# Altium integrated library Mastermind Devices.IntLib: 910 symbols (part 2 of 6) (continued)
## DIODE-DIP (continued)
DIODE   General purpose 1N400x type rectifier    (With bigger pads)   http://www.ladyada.net/library/pcb/eaglelibrary.html
footprint DO41-10
pins: A, C

## DIODE-DO214-AA
designator D13, comment 1N4007
SMD Diode DO214-AC
footprint DO214-AA
pins: A, C

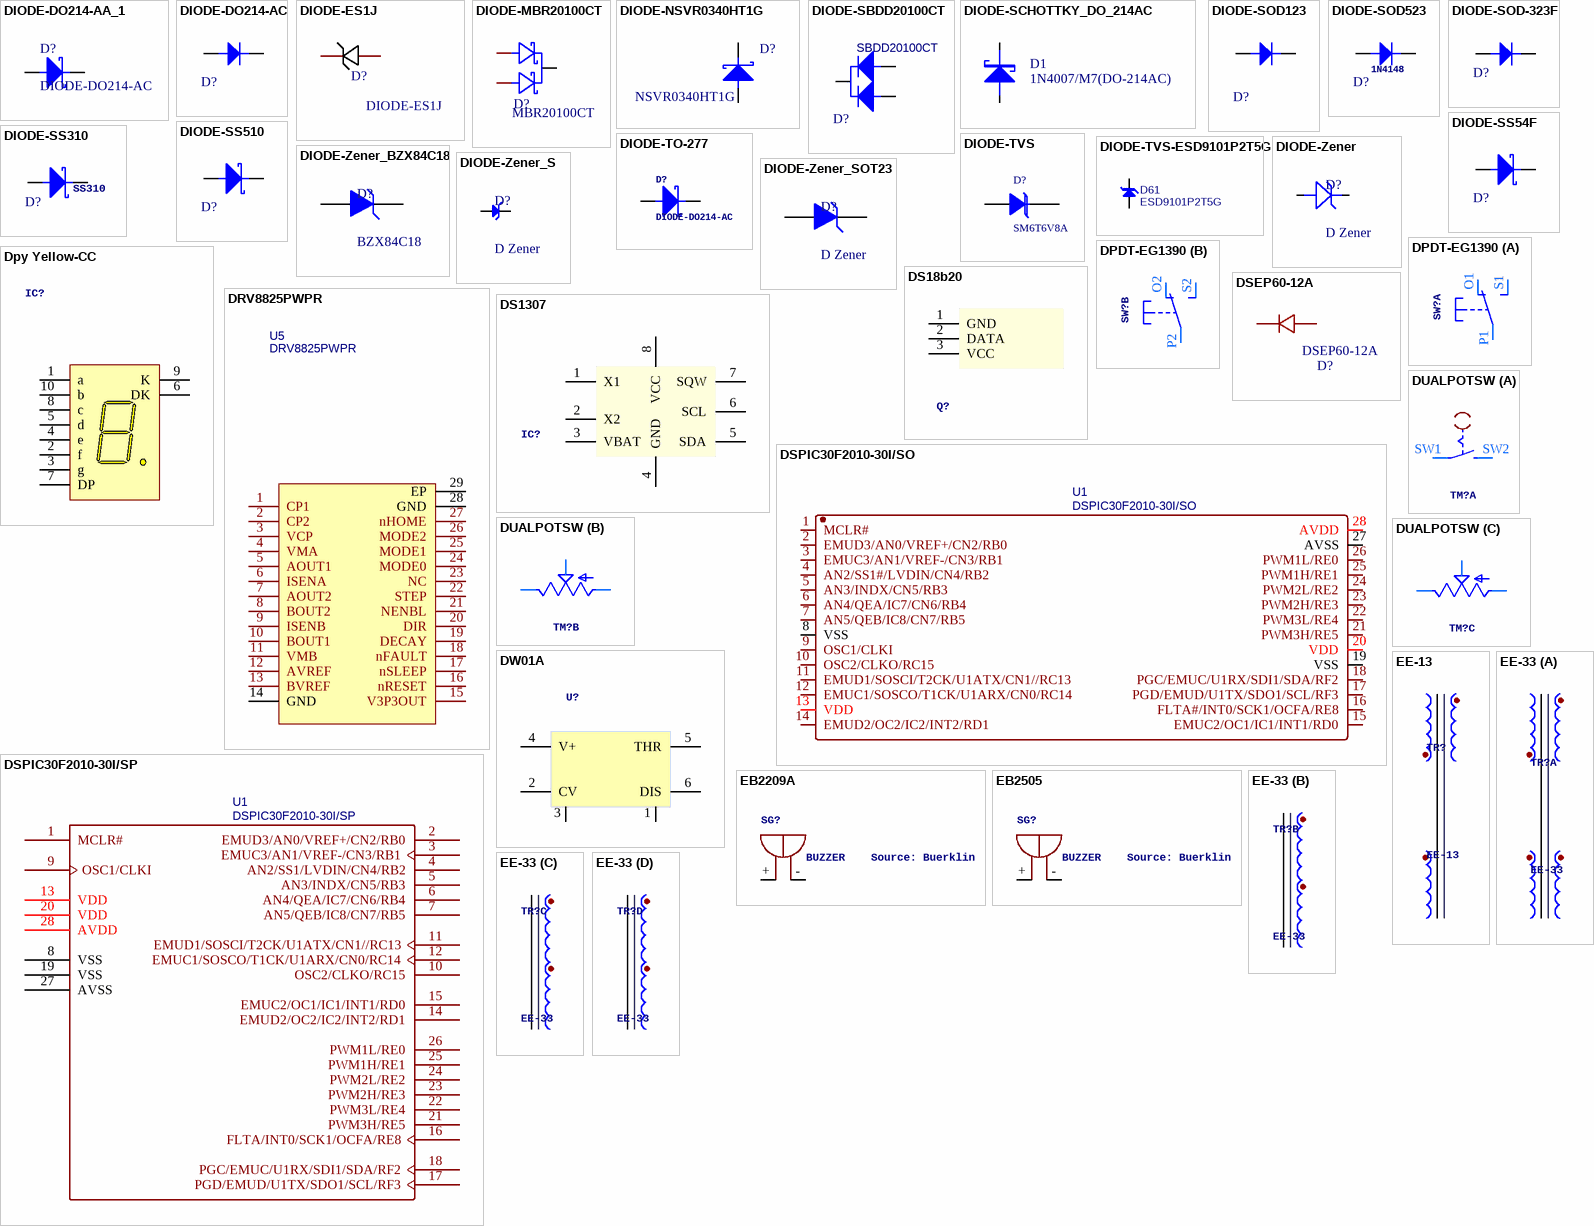
[diagram p10: symbols DIODE-DO214-AA_1 to EE-33]

## DIODE-DO214-AA_1
designator D?, comment DIODE-DO214-AC
SMD DIODE-DO214-AC
footprint DO214-AA
pins: A, C

## DIODE-DO214-AC
designator D?  (value not drawn)
Designator: *
footprint DO214-AC
pins: A, C

## DIODE-ES1J
designator D?
Manufacturer: MDD(辰达半导体); Manufacturer Part: ES1J; Symbol: ES1JG_C412438; Device: ES1J_C412438; Add into BOM: yes; Forward Voltage (Vf@If): 1.7V@1A; Reverse Leakage Current: 5uA@600V; LCSC Part Name: 电压:600V 电流:1A; Supplier Part: C412438; Supplier Footprint: SMA; JLCPCB Part Class: Extended Part; Datasheet: https://atta.szlcsc.com/upload/public/pdf/source/20230314/8FCBE4D1988E86B6B35ACD92F03E7C76.pdf; Supplier: LCSC; Convert to PCB: yes; Operating Temperature: -55℃~+150℃@(Tj)
footprint SMA_L4.4-W2.8-LS5.4-RD
pins: 1 C, 2 A

## DIODE-MBR20100CT
designator D?, comment MBR20100CT
Manufacturer: 晶导微电子; Symbol: MBR20100CT_C779290; Add into BOM: yes; Diode Configuration: 1 Pair Common Cathode; Voltage - Forward(Vf@If): 850mV@10A; Voltage - DC Reverse(Vr): 100V; Current - Rectified: 20A; Reverse Leakage Current (Ir): 50uA@100V; Operating Junction Temperature Range: -55℃~+150℃; Non-Repetitive Peak Forward Surge Current: 150A; Device: MBR20100CT_C779290; LCSC Part Name: 电压:100V 电流:20A; Supplier Part: C779290; Manufacturer Part: MBR20100CT; Supplier Footprint: TO-220; JLCPCB Part Class: Extended Part; Datasheet: https://item.szlcsc.com/datasheet/MBR20100CT/828963.html; Supplier: LCSC; Convert to PCB: yes
footprint TO-220-3_L10.0-W4.5-P2.54-L
3D model TO-220-3_L10.0-W4.5-P2.54-L
pins: 1 A, 2 K, 3 A

## DIODE-NSVR0340HT1G
designator D?, comment NSVR0340HT1G
Schottky Diode / NSVR0340HT1G
footprint SOD-323
pins: A, K C

## DIODE-SBDD20100CT
designator D?, comment SBDD20100CT
Schottky Barrier Diodes; Manufacturer: CJ(江苏长电/长晶); Contributor: LCSC; Supplier: LCSC; Supplier Part: C513356; Manufacturer Part: SBDD20100CT; JLCPCB Part Class: Extended Part; spicePre: U; spiceSymbolName: SBDD20100CT
footprint TO252
pins: 1 A, 2 A, 3 K

## DIODE-SCHOTTKY_DO_214AC
designator D1, comment 1N4007/M7(DO-214AC)
Surface mount schottky diode DO-214AC(SMA) Package
footprint SMT_DIODE_DO_214AC (DO-214AC(SMA) Package)
pins: 1 A, 2 K

## DIODE-SOD123
designator D?
Schottky Diode
footprint SOD-123
footprint SOD-123HE1_L3.0-W2.0-LS3.7-RD
pins: 1 C, 2 A

## DIODE-SOD523
designator D?, comment 1N4148
footprint SOD-523
pins: A, K C

## DIODE-SOD-323F
designator D?, comment Diode   SMADIODE - SMA Surface Mount Package  20V 1A Schottky Diode Digikey: 641-1014-6-ND    DO-1N4148 - Through Hole Small Current Diode SOD-123 20V 1 A (.5mV Vf) Schottky Diode - Digikey: MBRX120TPMSCT-ND    SOD-323 10V 570mA (.38mV Vf, 3ns) Schottky Diode - Digikey: ZLLS410CT-ND    SOD-523 30V 30mA Schottky Diode (RB751S-40TE61) - Digikey: RB751S-40TE61CT-ND    SOT23-R/W - SOT23 Package (R = Solder Paste/Reflow Ovens, W = Hand-Soldering)  BAT54Film 40V 300mA - Digikey: 497-7162-1-ND  (value not drawn)
Parameter 1: *
footprint SOD-323
pins: A, K C

## DIODE-SS54F
designator D?, comment DIODE-DO214-AC  (value not drawn)
Schottky Diode; Designator: *
footprint DO214-AC
footprint DO-214AB_L6.9-W5.9-LS7.9-RD
pins: A, C

## DIODE-SS310
designator D?, comment SS310
Schottky Diode
footprint DO214A
pins: 1 A, 2 C

## DIODE-SS510
designator D?, comment SS510  (value not drawn)
Schottky Diode; Designator: *
footprint SMC_L7.1-W6.2-LS8.1-RD
pins: 1 C, 2 A

## DIODE-TO-277
designator D?, comment DIODE-DO214-AC
Schottky Diode
footprint TO-277
pins: A, C

## DIODE-TVS
designator D?, comment SM6T6V8A
Tvs Diode, 6.2V, 5W; Manufacturer: Microsemi; Revision: 31-Oct-2003
footprint DO214
pins: 1 A, 2 K

## DIODE-TVS-ESD9101P2T5G
designator D61, comment ESD9101P2T5G
ESD Protection Diode; Manufacturer Name: OnSemi; Manufacturer Part No.: ESD9101P2T5G
footprint SOD-923 (SOD-923, 2-Leads, Body 0.60x1.00mm, IPC Medium Density)
pins: 1 C (power), 2 A (power)

## DIODE-Zener
designator D?, comment D Zener
Zener Diode; Published: 8-Jun-2000; LatestRevisionDate: 17-Jul-2002; LatestRevisionNote: Re-released for DXP Platform.; PackageReference: DIODE-0.7; Publisher: Altium Limited; PackageDescription: Diode, Thru-Hole; 2 Leads; 0.7 in Pin Spacing
simulation model ZENER (Diode)
signal-integrity model D Zener
footprint SOD-323
footprint DO100-AA
footprint DO-1N4148
footprint DO-1N4148 - 10mm
footprint SOD-123HE1_L3.0-W2.0-LS3.7-RD - KA
footprint DO-35_BD1.7-L3.6-P10.00-D0.5-FD
pins: A, K

## DIODE-Zener_BZX84C18
designator D?, comment BZX84C18
Zener Diode 18V; Published: 8-Jun-2000; LatestRevisionDate: 17-Jul-2002; LatestRevisionNote: Re-released for DXP Platform.; PackageReference: DIODE-0.7; Publisher: Altium Limited; PackageDescription: Diode, Thru-Hole; 2 Leads; 0.7 in Pin Spacing
footprint SOT23; pin to pad 1>1+2
pins: 1 A, 3 K

## DIODE-Zener_S
designator D?, comment D Zener
Zener Diode, Vz=15V, 300mW; Published: 8-Jun-2000; LatestRevisionDate: 17-Jul-2002; LatestRevisionNote: Re-released for DXP Platform.; PackageReference: DIODE-0.7; Publisher: Altium Limited; PackageDescription: Diode, Thru-Hole; 2 Leads; 0.7 in Pin Spacing
simulation model ZENER (Diode)
signal-integrity model D Zener
footprint SOD-323
pins: A (power), K C (power)

## DIODE-Zener_SOT23
designator D?, comment D Zener
Zener Diode; Published: 8-Jun-2000; LatestRevisionDate: 17-Jul-2002; LatestRevisionNote: Re-released for DXP Platform.; PackageReference: DIODE-0.7; Publisher: Altium Limited; PackageDescription: Diode, Thru-Hole; 2 Leads; 0.7 in Pin Spacing
footprint SOT23
pins: 1 A, 3 K

## DPDT-EG1390
designator SW?
footprint EG1390
part A pins: O1 O, P1 P, S1 S
part B pins: O2 O, P2 P, S2 S

## Dpy Yellow-CC
designator IC?, comment TIMERChanged DIP package to have round (not oval) pin pads    http://www.ladyada.net/library/pcb/eaglelibrary.html  (value not drawn)
footprint 7-Segment
pins: 1 a "Anode", 2 f "Anode", 3 g "Anode", 4 e "Anode", 5 d "Anode", 6 DK "Cathode", 7 DP "Anode", 8 c "Anode", 9 K "Cathode", 10 b "Anode"

## DRV8825PWPR
designator U5
BOM_Manufacturer: TI(德州仪器); BOM_Supplier: LCSC; BOM_Manufacturer Part: DRV8825PWPR; BOM_Supplier Part: C81582; BOM_JLCPCB Part Class: Extended Part; spicePre: U; spiceSymbolName: DRV8825PWPR
footprint HTSSOP-28_L9.7-W4.4-P0.65-LS6.4-BL-EP
pins: 1 CP1, 2 CP2, 3 VCP, 4 VMA, 5 AOUT1, 6 ISENA, 7 AOUT2, 8 BOUT2, 9 ISENB, 10 BOUT1, 11 VMB, 12 AVREF, 13 BVREF, 14 GND, 15 V3P3OUT, 16 nRESET, 17 nSLEEP, 18 nFAULT, 19 DECAY, 20 DIR, 21 NENBL, 22 STEP, 23 NC, 24 MODE0, 25 MODE1, 26 MODE2, 27 nHOME, 28 GND, 29 EP

## DS18b20
designator Q?
Dellas temperature sensor
footprint TO92-INLINE
pins: 1 GND, 2 DATA, 3 VCC

## DS1307
designator IC?, comment DS1307   Real time clock (RTC) with battery backup ability. Talk to it via i2c  (value not drawn)
footprint DIL08
footprint SOP8
pins: 1 X1, 2 X2, 3 VBAT, 4 GND, 5 SDA, 6 SCL, 7 SQW (power), 8 VCC (power)

## DSEP60-12A
designator D?
Manufacturer: Littelfuse/IXYS; Add into BOM: yes; Forward Voltage (Vf@If): 2.66V@60A; Reverse Leakage Current: 650uA@1.2kV; Symbol: DSEP60-12A; Device: DSEP60-12A; LCSC Part Name: 电压:1.2kV 电流:60A; Supplier Part: C130473; Manufacturer Part: DSEP60-12A; Supplier Footprint: TO-247AC; JLCPCB Part Class: Extended Part; Datasheet: https://atta.szlcsc.com/upload/public/pdf/source/20171113/C130473_15105610714251115425.pdf; Supplier: LCSC; Convert to PCB: yes; Operating Temperature: -55℃~+175℃@(Tj)
footprint TO-247AC_L15.8-W5.0-P10.88-L
3D model TO-247AC_2PIN-L15.8-W5.0-H25.0-P10.88-L
pins: 1 K, 2 A

## DSPIC30F2010-30I/SO
designator U1
Manufacturer: MICROCHIP(美国微芯); Supplier: LCSC; Manufacturer Part: DSPIC30F2010-30I/SO; Supplier Part: C9797; JLCPCB Part Class: Extended Part; spicePre: U; spiceSymbolName: DSPIC30F2010-30I/SO
footprint SOIC-28_L18.0-W7.5-P1.27-LS10.3-BL
pins: 1 MCLR#, 2 EMUD3/AN0/VREF+/CN2/RB0, 3 EMUC3/AN1/VREF-/CN3/RB1, 4 AN2/SS1#/LVDIN/CN4/RB2, 5 AN3/INDX/CN5/RB3, 6 AN4/QEA/IC7/CN6/RB4, 7 AN5/QEB/IC8/CN7/RB5, 8 VSS, 9 OSC1/CLKI, 10 OSC2/CLKO/RC15, 11 EMUD1/SOSCI/T2CK/U1ATX/CN1//RC13, 12 EMUC1/SOSCO/T1CK/U1ARX/CN0/RC14, 13 VDD, 14 EMUD2/OC2/IC2/INT2/RD1, 15 EMUC2/OC1/IC1/INT1/RD0, 16 FLTA#/INT0/SCK1/OCFA/RE8, 17 PGD/EMUD/U1TX/SDO1/SCL/RF3, 18 PGC/EMUC/U1RX/SDI1/SDA/RF2, 19 VSS, 20 VDD, 21 PWM3H/RE5, 22 PWM3L/RE4, 23 PWM2H/RE3, 24 PWM2L/RE2, 25 PWM1H/RE1, 26 PWM1L/RE0, 27 AVSS, 28 AVDD

## DSPIC30F2010-30I/SP
designator U1
Manufacturer: MICROCHIP(美国微芯); Supplier: LCSC; Manufacturer Part: DSPIC30F2010-30I/SP; Supplier Part: C134088; JLCPCB Part Class: Extended Part; spicePre: U; spiceSymbolName: DSPIC30F2010-30I/SP
footprint DIP-28_L34.6-W7.3-P2.54-LS10.2-BL
footprint SOIC-28_L18.0-W7.5-P1.27-LS10.3-BL
pins: 1 MCLR#, 2 EMUD3/AN0/VREF+/CN2/RB0, 3 EMUC3/AN1/VREF-/CN3/RB1, 4 AN2/SS1/LVDIN/CN4/RB2, 5 AN3/INDX/CN5/RB3, 6 AN4/QEA/IC7/CN6/RB4, 7 AN5/QEB/IC8/CN7/RB5, 8 VSS, 9 OSC1/CLKI, 10 OSC2/CLKO/RC15, 11 EMUD1/SOSCI/T2CK/U1ATX/CN1//RC13, 12 EMUC1/SOSCO/T1CK/U1ARX/CN0/RC14, 13 VDD, 14 EMUD2/OC2/IC2/INT2/RD1, 15 EMUC2/OC1/IC1/INT1/RD0, 16 FLTA/INT0/SCK1/OCFA/RE8, 17 PGD/EMUD/U1TX/SDO1/SCL/RF3, 18 PGC/EMUC/U1RX/SDI1/SDA/RF2, 19 VSS, 20 VDD, 21 PWM3H/RE5, 22 PWM3L/RE4, 23 PWM2H/RE3, 24 PWM2L/RE2, 25 PWM1H/RE1, 26 PWM1L/RE0, 27 AVSS, 28 AVDD

## DUALPOTSW
designator TM?
footprint RK0971221
part A pins: SW1 P, SW2 S
part B pins: A2 E, B2 A, W2 S
part C pins: A1 E, B1 A, W1 S

## DW01A
designator U?
footprint SOT23-6
pins: 1 TR, 2 CV, 3 GND (power), 4 V+ (power), 5 THR, 6 DIS

## EB2209A
designator SG?, comment BUZZER    Source: Buerklin
OC_FARNELL: unknown; OC_NEWARK: unknown
footprint EB2209A
pins: +, -

## EB2505
designator SG?, comment BUZZER    Source: Buerklin
OC_FARNELL: unknown; OC_NEWARK: unknown
footprint EB2505
pins: +, -

## EE-13
designator TR?
TRANSFORMER   1 primary winding, 2 secondary windings   ERA
footprint EE13
footprint EE13 - thx208
pins: 1, 2, 3, 4, 5, 6

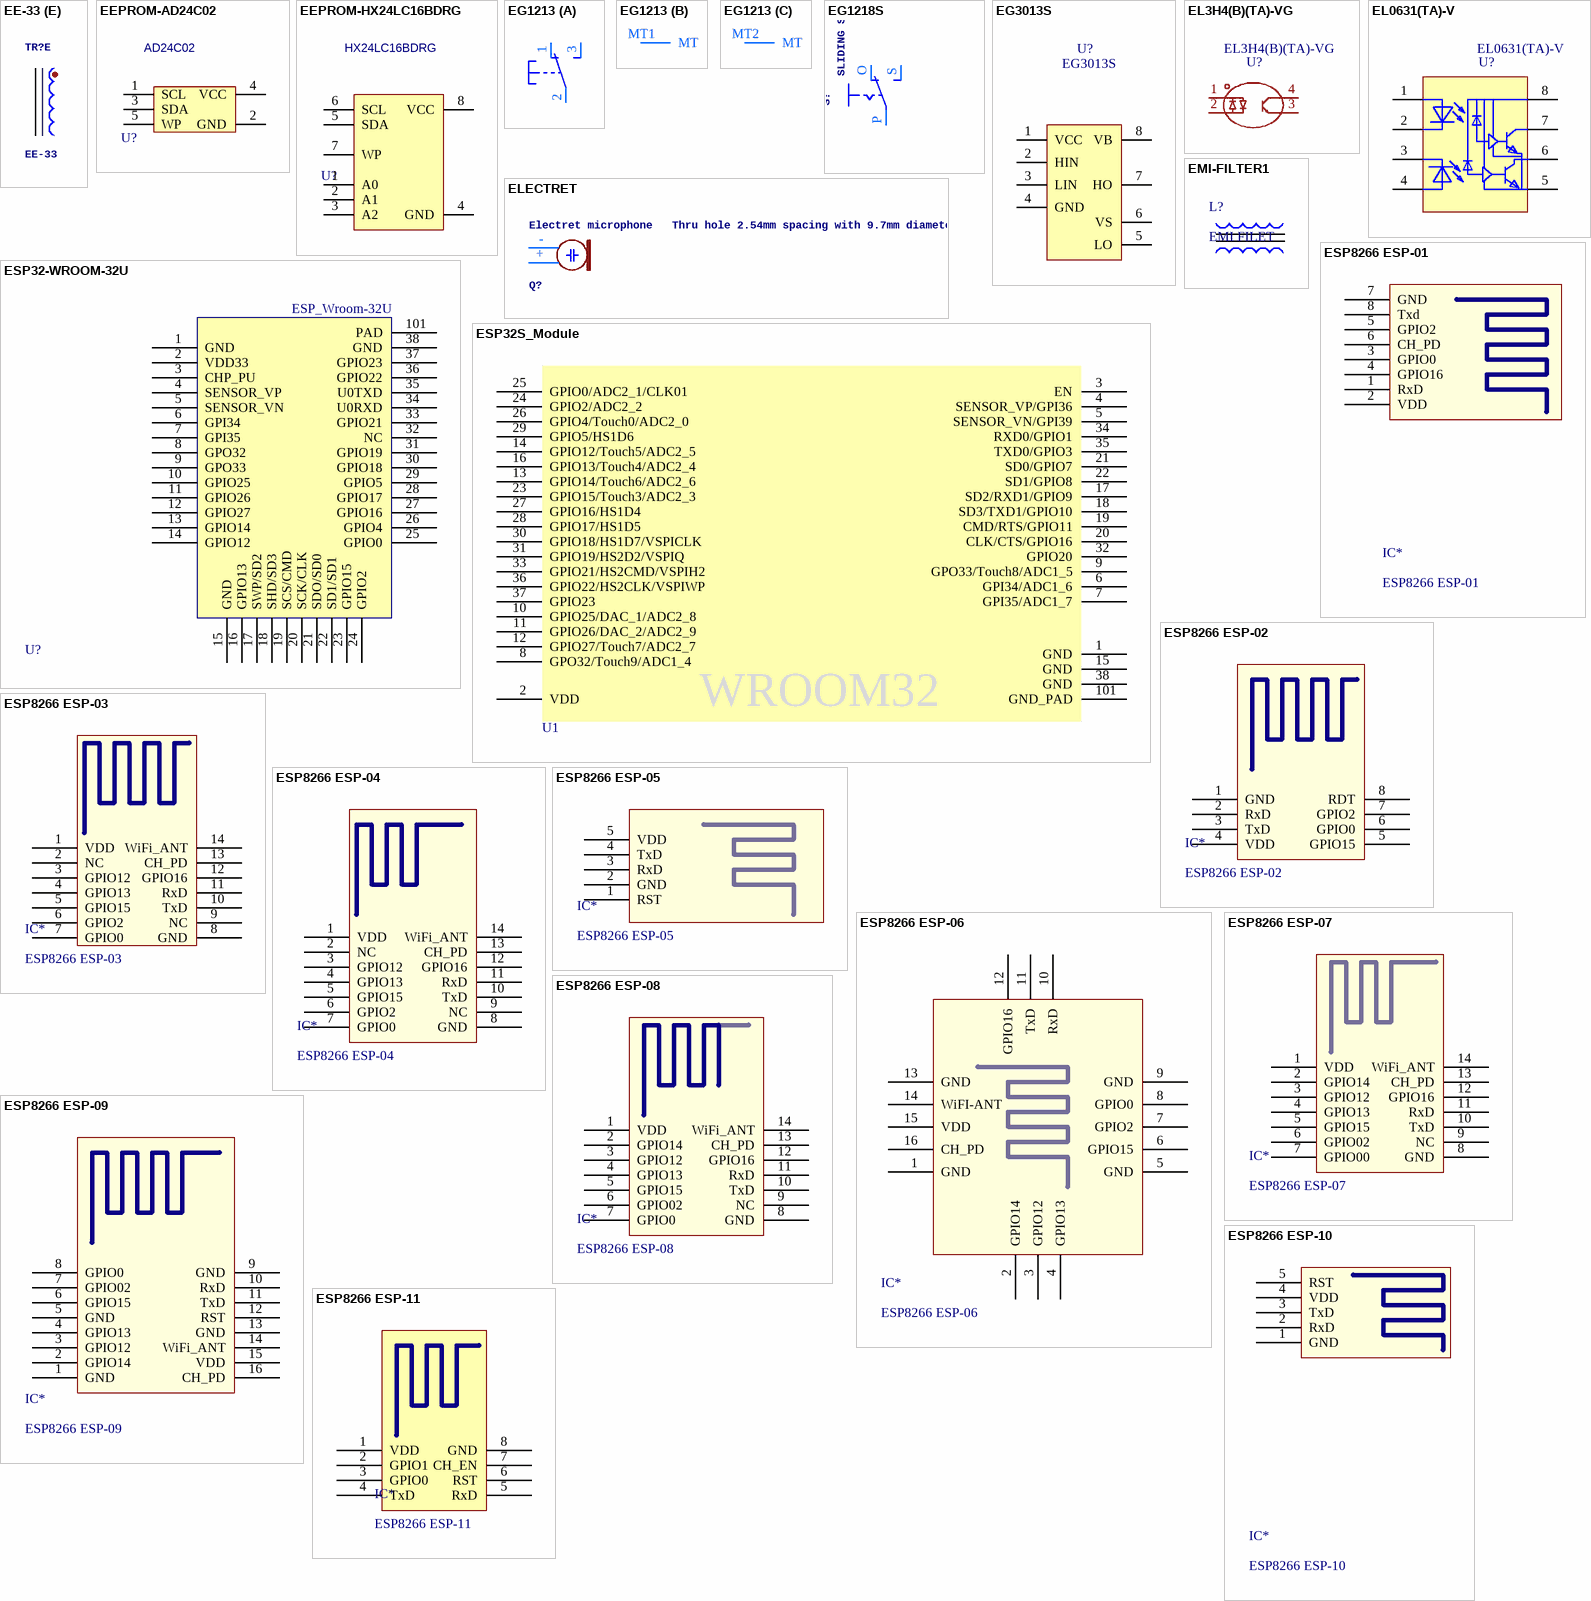
[diagram p11: symbols EE-33 to ESP8266 ESP-11]

## EE-33
designator TR?
EI33 EE33 18+18pin Vertical Transfomer Bobbin+PC40 ferrite core
footprint EE33
part A pins: 1 NC hidden to GND, 2 NC hidden to GND, 3 NC hidden to GND, 13, 14, 15, 16, 19, 20, 21 NC hidden to GND, 22, 23
part B pins: 4, 5, 6
part C pins: 7, 8, 9
part D pins: 10, 11, 12
part E pins: 17, 18

## EEPROM-AD24C02
designator U?, comment AD24C02
Manufacturer: IDCHIP(英锐芯); Contributor: lcsc; Supplier: LCSC; Supplier Part: C5125083; Manufacturer Part: AD24C02; JLCPCB Part Class: Extended Part; spicePre: U; spiceSymbolName: AD24C02
footprint SOT23-5L
pins: 1 SCL, 2 GND, 3 SDA, 4 VCC, 5 WP

## EEPROM-HX24LC16BDRG
designator U?, comment HX24LC16BDRG
EEPROM; Manufacturer: HGC(深圳汉芯); Contributor: lcsc; Supplier: LCSC; Supplier Part: C2987259; Manufacturer Part: HX24LC16BDRG; JLCPCB Part Class: Extended Part; spicePre: U; spiceSymbolName: HX24LC16BDRG
footprint SOIC-8_L4.9-W3.9-P1.27-LS6.0-BL
footprint SOIC-8E (SOIC, 8-Leads, Body 4.90x3.90mm, Pitch 1.27mm, IPC Medium Density)
pins: 1 A0, 2 A1, 3 A2, 4 GND, 5 SDA, 6 SCL, 7 WP, 8 VCC

## EG1213
designator S?, comment E-Switch right-angle slide SPDT Part #EG1213    http://www.ladyada.net/library/eagle  (value not drawn)
footprint EG1213
part A pins: 1 O, 2 P, 3 S
part B pins: MT1 MT
part C pins: MT2 MT

## EG1218S
designator S?, comment SLIDING SWITCH   0.1" spacing through hole, vertical SPDT slide switch    http://www.ladyada.net/library/pcb/eaglelibrary.html
footprint EG1218
pins: O, P, S

## EG3013S
designator U?
SOP-8 Gate Drivers ROHS; Manufacturer: EG(屹晶微); Add into BOM: yes; Symbol: EG3013S; Device: EG3013S; LCSC Part Name: EG3013S; Supplier Part: C5138297; Manufacturer Part: EG3013S; Supplier Footprint: SOP-8; JLCPCB Part Class: Extended Part; Datasheet: https://atta.szlcsc.com/upload/public/pdf/source/20240401/B57332368F1567A90B75A8EC20454C1B.pdf; Supplier: LCSC; Convert to PCB: yes
footprint SOP8
pins: 1 VCC, 2 HIN, 3 LIN, 4 GND, 5 LO, 6 VS, 7 HO, 8 VB

## EL3H4(B)(TA)-VG
designator U?
Manufacturer: EVERLIGHT(亿光); Add into BOM: yes; Symbol: EL3H4(B)(TA)-VG; Device: EL3H4(B)(TA)-VG; LCSC Part Name: EL3H4(B)(TA)-VG; Supplier Part: C146689; Manufacturer Part: EL3H4(B)(TA)-VG; Supplier Footprint: SOP-4-1.27mm; JLCPCB Part Class: Extended Part; Supplier: LCSC; Convert to PCB: yes
footprint OPTO-SMD-4_L4.4-W2.7-P1.27-LS7.0-TL
pins: 1 A, 2 C, 3 E, 4 C

## EL0631(TA)-V
designator U?
Manufacturer: EVERLIGHT(亿光); Add into BOM: yes; Input Type: DC; Supply Voltage: 7V; Isolation Voltage(rms): 3.75kV; Common Mode Transient Immunity (CMTI): 10kV/us; Data Rate: 10Mbit/s; Propagation Delay tpLH/tpHL: 100ns；100ns; Number of Channels: 2; Symbol: EL0631(TA)-V; Device: EL0631(TA)-V; LCSC Part Name: DC输入 2通道 隔离电压(rms):3750V; Supplier Part: C110806; Manufacturer Part: EL0631(TA)-V; Supplier Footprint: SOIC-8; JLCPCB Part Class: Extended Part; Datasheet: https://atta.szlcsc.com/upload/public/pdf/source/20170505/1493957884590.pdf; Supplier: LCSC; Convert to PCB: yes; Operating Temperature: -40℃~+100℃
footprint SOIC-8_L4.9-W3.9-P1.27-LS6.0-BL
pins: 1, 2, 3, 4, 5, 6, 7, 8

## ELECTRET
designator Q?, comment Electret microphone   Thru hole 2.54mm spacing with 9.7mm diameter
footprint 9.7ELECTRET
pins: + 2, - 1

## EMI-FILTER1
designator L?, comment EMI FILET
Common Mode Noise Filter
footprint FIL_DLW5BTM501SQ2L
footprint FIL_CoreXX
footprint FIL_Z0021A
pins: 1, 2, 3, 4

## ESP32-WROOM-32U
designator U?, comment ESP-Wroom-32U_Module  (value not drawn)
WiFi Modules ROHS; Datasheet: https://espressif.com/sites/default/files/documentation/esp_wroom_32_datasheet_en.pdf
footprint ESP32-WROOM-32U (Esp32S Module wide for hand soldering)
pins: 1 GND (power), 2 VDD33 (power), 3 CHP_PU (power), 4 SENSOR_VP, 5 SENSOR_VN, 6 GPI34, 7 GPI35, 8 GPO32, 9 GPO33, 10 GPIO25, 11 GPIO26, 12 GPIO27, 13 GPIO14, 14 GPIO12, 15 GND (power), 16 GPIO13, 17 SWP/SD2, 18 SHD/SD3, 19 SCS/CMD, 20 SCK/CLK, 21 SDO/SD0, 22 SD1/SD1, 23 GPIO15, 24 GPIO2, 25 GPIO0, 26 GPIO4, 27 GPIO16, 28 GPIO17, 29 GPIO5, 30 GPIO18, 31 GPIO19, 32 NC, 33 GPIO21, 34 U0RXD, 35 U0TXD, 36 GPIO22, 37 GPIO23, 38 GND (power), 101 PAD (power)
text: ESP_Wroom-32U

## ESP32S_Module
designator U1  (value not drawn)
Esp-32S; Datasheet: https://espressif.com/sites/default/files/documentation/esp_wroom_32_datasheet_en.pdf
footprint ESP32S (ESP32S-Module)
footprint ESP32S_W (Esp32S Module wide for hand soldering)
pins: 1 GND (power), 2 VDD (power), 3 EN (power), 4 SENSOR_VP/GPI36, 5 SENSOR_VN/GPI39, 6 GPI34/ADC1_6, 7 GPI35/ADC1_7, 8 GPO32/Touch9/ADC1_4, 9 GPO33/Touch8/ADC1_5, 10 GPIO25/DAC_1/ADC2_8, 11 GPIO26/DAC_2/ADC2_9, 12 GPIO27/Touch7/ADC2_7, 13 GPIO14/Touch6/ADC2_6, 14 GPIO12/Touch5/ADC2_5, 15 GND (power), 16 GPIO13/Touch4/ADC2_4, 17 SD2/RXD1/GPIO9, 18 SD3/TXD1/GPIO10, 19 CMD/RTS/GPIO11, 20 CLK/CTS/GPIO16, 21 SD0/GPIO7, 22 SD1/GPIO8, 23 GPIO15/Touch3/ADC2_3, 24 GPIO2/ADC2_2, 25 GPIO0/ADC2_1/CLK01, 26 GPIO4/Touch0/ADC2_0, 27 GPIO16/HS1D4, 28 GPIO17/HS1D5, 29 GPIO5/HS1D6, 30 GPIO18/HS1D7/VSPICLK, 31 GPIO19/HS2D2/VSPIQ, 32 GPIO20, 33 GPIO21/HS2CMD/VSPIH2, 34 RXD0/GPIO1, 35 TXD0/GPIO3, 36 GPIO22/HS2CLK/VSPIWP, 37 GPIO23, 38 GND (power), 101 GND_PAD (power)
text: WROOM32

## ESP8266 ESP-01
designator IC*
footprint ESP8266 ESP-01
pins: 1 RxD, 2 VDD, 3 GPIO0, 4 GPIO16, 5 GPIO2, 6 CH_PD, 7 GND, 8 Txd

## ESP8266 ESP-02
designator IC*
footprint ESP8266 ESP-02
pins: 1 GND, 2 RxD, 3 TxD, 4 VDD, 5 GPIO15, 6 GPIO0, 7 GPIO2, 8 RDT

## ESP8266 ESP-03
designator IC*
footprint ESP8266 ESP-03
pins: 1 VDD, 2 NC, 3 GPIO12, 4 GPIO13, 5 GPIO15, 6 GPIO2, 7 GPIO0, 8 GND, 9 NC, 10 TxD, 11 RxD, 12 GPIO16, 13 CH_PD, 14 WiFi_ANT

## ESP8266 ESP-04
designator IC*
footprint ESP8266 ESP-04
pins: 1 VDD, 2 NC, 3 GPIO12, 4 GPIO13, 5 GPIO15, 6 GPIO2, 7 GPIO0, 8 GND, 9 NC, 10 TxD, 11 RxD, 12 GPIO16, 13 CH_PD, 14 WiFi_ANT

## ESP8266 ESP-05
designator IC*
footprint ESP8266 ESP-05
pins: 1 RST, 2 GND, 3 RxD, 4 TxD, 5 VDD

## ESP8266 ESP-06
designator IC*
footprint ESP8266 ESP-06
pins: 1 GND, 2 GPIO14, 3 GPIO12, 4 GPIO13, 5 GND, 6 GPIO15, 7 GPIO2, 8 GPIO0, 9 GND, 10 RxD, 11 TxD, 12 GPIO16, 13 GND, 14 WiFI-ANT, 15 VDD, 16 CH_PD

## ESP8266 ESP-07
designator IC*
pins: 1 VDD (power), 2 GPIO14, 3 GPIO12, 4 GPIO13, 5 GPIO15, 6 GPIO02, 7 GPIO00, 8 GND, 9 NC, 10 TxD, 11 RxD, 12 GPIO16, 13 CH_PD, 14 WiFi_ANT

## ESP8266 ESP-08
designator IC*
footprint ESP8266 ESP-08
pins: 1 VDD (power), 2 GPIO14, 3 GPIO12, 4 GPIO13, 5 GPIO15, 6 GPIO02, 7 GPIO0, 8 GND, 9 NC, 10 TxD, 11 RxD, 12 GPIO16, 13 CH_PD, 14 WiFi_ANT

## ESP8266 ESP-09
designator IC*
footprint ESP8266 ESP-09
pins: 1 GND (power), 2 GPIO14, 3 GPIO12, 4 GPIO13, 5 GND (power), 6 GPIO15, 7 GPIO02, 8 GPIO0, 9 GND (power), 10 RxD, 11 TxD, 12 RST, 13 GND (power), 14 WiFi_ANT, 15 VDD (power), 16 CH_PD

## ESP8266 ESP-10
designator IC*
footprint ESP8266 ESP-10
pins: 1 GND, 2 RxD, 3 TxD, 4 VDD, 5 RST

## ESP8266 ESP-11
designator IC*
footprint ESP8266 ESP-11
pins: 1 VDD, 2 GPIO1, 3 GPIO0, 4 TxD, 5 RxD, 6 RST, 7 CH_EN, 8 GND
